# Altium footprint library texas.PCBLIB: 168 footprints (part 1 of 14)
Each footprint in its own frame and in the unit in brackets; x right, y up, seen from the top. Pads: shape width x height; smd on the part's side, far side on the other; paste and mask are expansions set on the pad; w line width, h text height; cw(c..) or ccw(c..) is an arc to the next point about the centre after c.
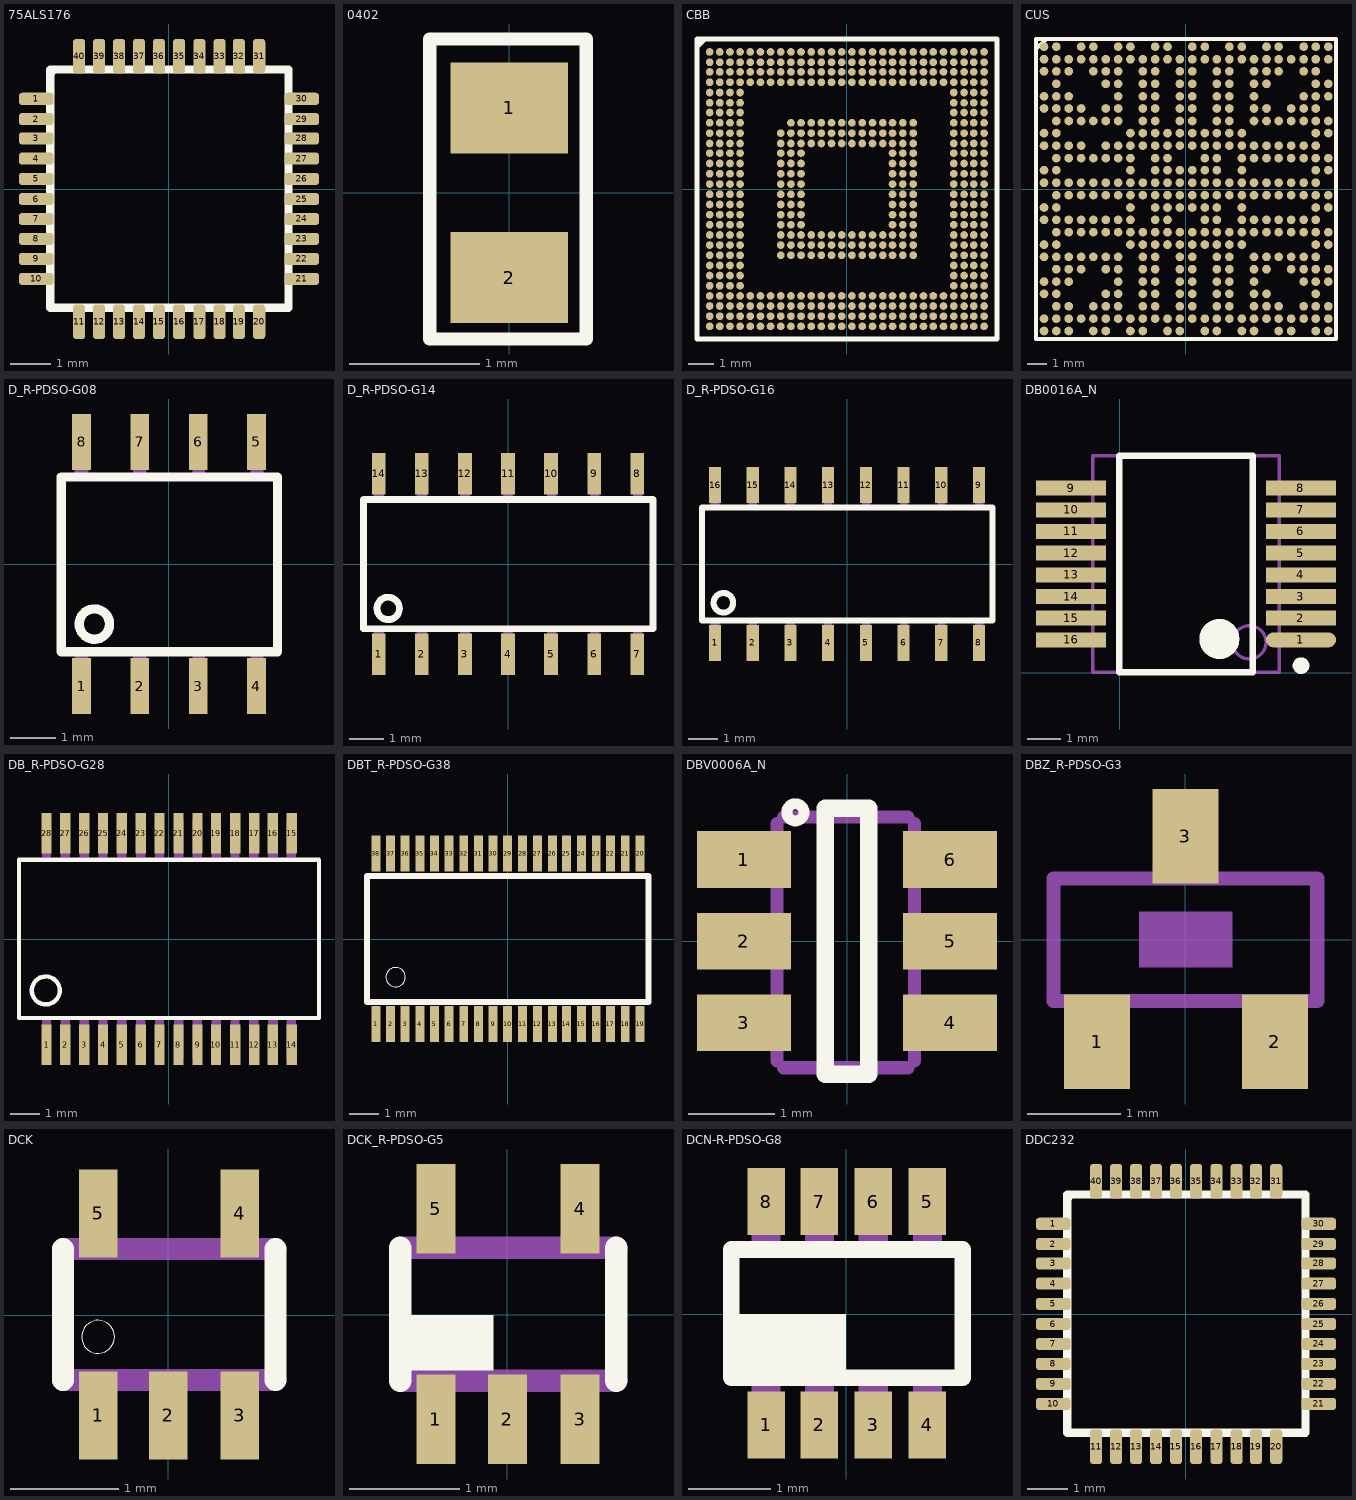
[diagram p0: the footprints below, top view; thin cyan lines are the x and y axes]

## 75ALS176 [mil]
pads (40):
  rrect50% 34x12 smd: 1(-130.91,89) 2(-130.91,69) 3(-130.91,50) 4(-130.91,30) 5(-130.91,10) 6(-130.91,-9.84) 7(-130.91,-29.53) 8(-130.91,-49.21) 9(-130.91,-68.9) 10(-130.91,-88.58) 21(131,-88.58) 22(131,-68.9) 23(131,-49.21) 24(131,-29.53) 25(131,-9.84) 26(131,10) 27(131,30) 28(131,50) 29(131,69) 30(131,89)
  rrect50% 12x34 smd: 11(-88.58,-130.91) 12(-68.9,-130.91) 13(-49.21,-130.91) 14(-29.53,-130.91) 15(-9.84,-130.91) 16(10,-130.91) 17(30,-130.91) 18(50,-130.91) 19(69,-130.91) 20(89,-130.91) 31(89,131) 32(69,131) 33(50,131) 34(30,131) 35(10,131) 36(-9.84,131) 37(-29.53,131) 38(-49.21,131) 39(-68.9,131) 40(-88.58,131)
Top Overlay:
  lines w8: -117.06,114 -113.19,118 ; -117.06,-117.06 118,-117.06 118,118 -117.06,118 -117.06,-117.06
Mechanical 4:
  rectangle: -133.86,85 -121.06,94
  rectangle: -133.86,65 -121.06,74
  rectangle: -133.86,45 -121.06,54
  rectangle: -133.86,25 -121.06,35
  rectangle: -133.86,6 -121.06,15
  rectangle: -133.86,-14.37 -121.06,-5.32
  rectangle: -133.86,-34.06 -121.06,-25
  rectangle: -133.86,-53.74 -121.06,-44.69
  rectangle: -133.86,-73.43 -121.06,-64.37
  rectangle: -133.86,-93.11 -121.06,-84.06
  rectangle: -93.11,-133.86 -84.06,-121.06
  rectangle: -73.43,-133.86 -64.37,-121.06
  rectangle: -53.74,-133.86 -44.69,-121.06
  rectangle: -34.06,-133.86 -25,-121.06
  rectangle: -14.37,-133.86 -5.32,-121.06
  rectangle: 6,-133.86 15,-121.06
  rectangle: 25,-133.86 35,-121.06
  rectangle: 45,-133.86 54,-121.06
  rectangle: 65,-133.86 74,-121.06
  rectangle: 85,-133.86 94,-121.06
  rectangle: 122,-93.11 134,-84.06
  rectangle: 122,-73.43 134,-64.37
  rectangle: 122,-53.74 134,-44.69
  rectangle: 122,-34.06 134,-25
  rectangle: 122,-14.37 134,-5.32
  rectangle: 122,6 134,15
  rectangle: 122,25 134,35
  rectangle: 122,45 134,54
  rectangle: 122,65 134,74
  rectangle: 122,85 134,94
  rectangle: 85,122 94,134
  rectangle: 65,122 74,134
  rectangle: 45,122 54,134
  rectangle: 25,122 35,134
  rectangle: 6,122 15,134
  rectangle: -14.37,122 -5.32,134
  rectangle: -34.06,122 -25,134
  rectangle: -53.74,122 -44.69,134
  rectangle: -73.43,122 -64.37,134
  rectangle: -93.11,122 -84.06,134

## 0402 [mm]
pads (2):
  rect 0.9x0.7 smd: 1(0,0.65) 2(0,-0.65)
Top Overlay:
  lines w0.102: -0.609,-1.121 -0.609,1.179 0.591,1.179 0.591,-1.121 -0.609,-1.121
3D body "wcr0603-402kfi.stp": height 0.45, standoff 0, extent -0.409,-0.821 0.391,0.779

## CBB [mil]
pads (515):
  rrect100% 12x12 smd: A1(-212.6,213) A2(-196.85,213) A3(-181.1,213) A4(-165.35,213) A5(-149.61,213) A6(-133.86,213) A7(-118.11,213) A8(-102.36,213) A9(-86.61,213) A10(-70.87,213) A11(-55.12,213) A12(-39.37,213) A13(-23.62,213) A14(-7.87,213) A15(8,213) A16(24,213) A17(40,213) A18(56,213) A19(71,213) A20(87,213) A21(103,213) A22(119,213) A23(134,213) A24(150,213) A25(166,213) A26(182,213) A27(197,213) A28(213,213) AA1(-212.6,-102.36) AA2(-196.85,-102.36) AA3(-181.1,-102.36) AA4(-165.35,-102.36) AA8(-102.36,-102.36) AA9(-86.61,-102.36) AA10(-70.87,-102.36) AA11(-55.12,-102.36) AA12(-39.37,-102.36) AA13(-23.62,-102.36) AA14(-7.87,-102.36) AA15(8,-102.36) AA16(24,-102.36) AA17(40,-102.36) AA18(56,-102.36) AA19(71,-102.36) AA20(87,-102.36) AA21(103,-102.36) AA25(166,-102.36) AA26(182,-102.36) AA27(197,-102.36) AA28(213,-102.36) AB1(-212.6,-118.11) AB2(-196.85,-118.11) AB3(-181.1,-118.11) AB4(-165.35,-118.11) AB25(166,-118.11) AB26(182,-118.11) AB27(197,-118.11) AB28(213,-118.11) AC1(-212.6,-133.86) AC2(-196.85,-133.86) AC3(-181.1,-133.86) AC4(-165.35,-133.86) AC25(166,-133.86) AC26(182,-133.86) AC27(197,-133.86) AC28(213,-133.86) AD1(-212.6,-149.61) AD2(-196.85,-149.61) AD3(-181.1,-149.61) AD4(-165.35,-149.61) AD25(166,-149.61) AD26(182,-149.61) AD27(197,-149.61) AD28(213,-149.61) AE1(-212.6,-165.35) AE2(-196.85,-165.35) AE3(-181.1,-165.35) AE4(-165.35,-165.35) AE5(-149.61,-165.35) AE6(-133.86,-165.35) AE7(-118.11,-165.35) AE8(-102.36,-165.35) AE9(-86.61,-165.35) AE10(-70.87,-165.35) AE11(-55.12,-165.35) AE12(-39.37,-165.35) AE13(-23.62,-165.35) AE14(-7.87,-165.35) AE15(8,-165.35) AE16(24,-165.35) AE17(40,-165.35) AE18(56,-165.35) AE19(71,-165.35) AE20(87,-165.35) AE21(103,-165.35) AE22(119,-165.35) AE23(134,-165.35) AE24(150,-165.35) AE25(166,-165.35) AE26(182,-165.35) AE27(197,-165.35) AE28(213,-165.35) AF1(-212.6,-181.1) AF2(-196.85,-181.1) AF3(-181.1,-181.1) AF4(-165.35,-181.1) AF5(-149.61,-181.1) AF6(-133.86,-181.1) AF7(-118.11,-181.1) AF8(-102.36,-181.1) AF9(-86.61,-181.1) AF10(-70.87,-181.1) AF11(-55.12,-181.1) AF12(-39.37,-181.1) AF13(-23.62,-181.1) AF14(-7.87,-181.1) AF15(8,-181.1) AF16(24,-181.1) AF17(40,-181.1) AF18(56,-181.1) AF19(71,-181.1) AF20(87,-181.1) AF21(103,-181.1) AF22(119,-181.1) AF23(134,-181.1) AF24(150,-181.1) AF25(166,-181.1) AF26(182,-181.1) AF27(197,-181.1) AF28(213,-181.1) AG1(-212.6,-196.85) AG2(-196.85,-196.85) AG3(-181.1,-196.85) AG4(-165.35,-196.85) AG5(-149.61,-196.85) AG6(-133.86,-196.85) AG7(-118.11,-196.85) AG8(-102.36,-196.85) AG9(-86.61,-196.85) AG10(-70.87,-196.85) AG11(-55.12,-196.85) AG12(-39.37,-196.85) AG13(-23.62,-196.85) AG14(-7.87,-196.85) AG15(8,-196.85) AG16(24,-196.85) AG17(40,-196.85) AG18(56,-196.85) AG19(71,-196.85) AG20(87,-196.85) AG21(103,-196.85) AG22(119,-196.85) AG23(134,-196.85) AG24(150,-196.85) AG25(166,-196.85) AG26(182,-196.85) AG27(197,-196.85) AG28(213,-196.85) AH1(-212.6,-212.6) AH2(-196.85,-212.6) AH3(-181.1,-212.6) AH4(-165.35,-212.6) AH5(-149.61,-212.6) AH6(-133.86,-212.6) AH7(-118.11,-212.6) AH8(-102.36,-212.6) AH9(-86.61,-212.6) AH10(-70.87,-212.6) AH11(-55.12,-212.6) AH12(-39.37,-212.6) AH13(-23.62,-212.6) AH14(-7.87,-212.6) AH15(8,-212.6) AH16(24,-212.6) AH17(40,-212.6) AH18(56,-212.6) AH19(71,-212.6) AH20(87,-212.6) AH21(103,-212.6) AH22(119,-212.6) AH23(134,-212.6) AH24(150,-212.6) AH25(166,-212.6) AH26(182,-212.6) AH27(197,-212.6) AH28(213,-212.6) B1(-212.6,197) B2(-196.85,197) B3(-181.1,197) B4(-165.35,197) B5(-149.61,197) B6(-133.86,197) B7(-118.11,197) B8(-102.36,197) B9(-86.61,197) B10(-70.87,197) B11(-55.12,197) B12(-39.37,197) B13(-23.62,197) B14(-7.87,197) B15(8,197) B16(24,197) B17(40,197) B18(56,197) B19(71,197) B20(87,197) B21(103,197) B22(119,197) B23(134,197) B24(150,197) B25(166,197) B26(182,197) B27(197,197) B28(213,197) C1(-212.6,182) C2(-196.85,182) C3(-181.1,182) C4(-165.35,182) C5(-149.61,182) C6(-133.86,182) C7(-118.11,182) C8(-102.36,182) C9(-86.61,182) C10(-70.87,182) C11(-55.12,182) C12(-39.37,182) C13(-23.62,182) C14(-7.87,182) C15(8,182) C16(24,182) C17(40,182) C18(56,182) C19(71,182) C20(87,182) C21(103,182) C22(119,182) C23(134,182) C24(150,182) C25(166,182) C26(182,182) C27(197,182) C28(213,182) D1(-212.6,166) D2(-196.85,166) D3(-181.1,166) D4(-165.35,166) D5(-149.61,166) D6(-133.86,166) D7(-118.11,166) D8(-102.36,166) D9(-86.61,166) D10(-70.87,166) D11(-55.12,166) D12(-39.37,166) D13(-23.62,166) D14(-7.87,166) D15(8,166) D16(24,166) D17(40,166) D18(56,166) D19(71,166) D20(87,166) D21(103,166) D22(119,166) D23(134,166) D24(150,166) D25(166,166) D26(182,166) D27(197,166) D28(213,166) E1(-212.6,150) E2(-196.85,150) E3(-181.1,150) E4(-165.35,150) E25(166,150) E26(182,150) E27(197,150) E28(213,150) F1(-212.6,134) F2(-196.85,134) F3(-181.1,134) F4(-165.35,134) F25(166,134) F26(182,134) F27(197,134) F28(213,134) G1(-212.6,119) G2(-196.85,119) G3(-181.1,119) G4(-165.35,119) G25(166,119) G26(182,119) G27(197,119) G28(213,119) H1(-212.6,103) H2(-196.85,103) H3(-181.1,103) H4(-165.35,103) H9(-86.61,103) H10(-70.87,103) H11(-55.12,103) H12(-39.37,103) H13(-23.62,103) H14(-7.87,103) H15(8,103) H16(24,103) H17(40,103) H18(56,103) H19(71,103) H20(87,103) H21(103,103) H25(166,103) H26(182,103) H27(197,103) H28(213,103) J1(-212.6,87) J2(-196.85,87) J3(-181.1,87) J4(-165.35,87) J8(-102.36,87) J9(-86.61,87) J10(-70.87,87) J11(-55.12,87) J12(-39.37,87) J13(-23.62,87) J14(-7.87,87) J15(8,87) J16(24,87) J17(40,87) J18(56,87) J19(71,87) J20(87,87) J21(103,87) J25(166,87) J26(182,87) J27(197,87) J28(213,87) K1(-212.6,71) K2(-196.85,71) K3(-181.1,71) K4(-165.35,71) K8(-102.36,71) K9(-86.61,71) K10(-70.87,71) K11(-55.12,71) K12(-39.37,71) K13(-23.62,71) K14(-7.87,71) K15(8,71) K16(24,71) K17(40,71) K18(56,71) K19(71,71) K20(87,71) K21(103,71) K25(166,71) K26(182,71) K27(197,71) K28(213,71) L1(-212.6,56) L2(-196.85,56) L3(-181.1,56) L4(-165.35,56) L8(-102.36,56) L9(-86.61,56) L10(-70.87,56) L19(71,56) L20(87,56) L21(103,56) L25(166,56) L26(182,56) L27(197,56) L28(213,56) M1(-212.6,40) M2(-196.85,40) M3(-181.1,40) M4(-165.35,40) M8(-102.36,40) M9(-86.61,40) M10(-70.87,40) M19(71,40) M20(87,40) M21(103,40) M25(166,40) M26(182,40) M27(197,40) M28(213,40) N1(-212.6,24) N2(-196.85,24) N3(-181.1,24) N4(-165.35,24) N8(-102.36,24) N9(-86.61,24) N10(-70.87,24) N19(71,24) N20(87,24) N21(103,24) N25(166,24) N26(182,24) N27(197,24) N28(213,24) P1(-212.6,8) P2(-196.85,8) P3(-181.1,8) P4(-165.35,8) P8(-102.36,8) P9(-86.61,8) P10(-70.87,8) P19(71,8) P20(87,8) P21(103,8) P25(166,8) P26(182,8) P27(197,8) P28(213,8) R1(-212.6,-7.87) R2(-196.85,-7.87) R3(-181.1,-7.87) R4(-165.35,-7.87) R8(-102.36,-7.87) R9(-86.61,-7.87) R10(-70.87,-7.87) R19(71,-7.87) R20(87,-7.87) R21(103,-7.87) R25(166,-7.87) R26(182,-7.87) R27(197,-7.87) R28(213,-7.87) T1(-212.6,-23.62) T2(-196.85,-23.62) T3(-181.1,-23.62) T4(-165.35,-23.62) T8(-102.36,-23.62) T9(-86.61,-23.62) T10(-70.87,-23.62) T19(71,-23.62) T20(87,-23.62) T21(103,-23.62) T25(166,-23.62) T26(182,-23.62) T27(197,-23.62) T28(213,-23.62) U1(-212.6,-39.37) U2(-196.85,-39.37) U3(-181.1,-39.37) U4(-165.35,-39.37) U8(-102.36,-39.37) U9(-86.61,-39.37) U10(-70.87,-39.37) U19(71,-39.37) U20(87,-39.37) U21(103,-39.37) U25(166,-39.37) U26(182,-39.37) U27(197,-39.37) U28(213,-39.37) V1(-212.6,-55.12) V2(-196.85,-55.12) V3(-181.1,-55.12) V4(-165.35,-55.12) V8(-102.36,-55.12) V9(-86.61,-55.12) V10(-70.87,-55.12) V19(71,-55.12) V20(87,-55.12) V21(103,-55.12) V25(166,-55.12) V26(182,-55.12) V27(197,-55.12) V28(213,-55.12) W1(-212.6,-70.87) W2(-196.85,-70.87) W3(-181.1,-70.87) W4(-165.35,-70.87) W8(-102.36,-70.87) W9(-86.61,-70.87) W10(-70.87,-70.87) W11(-55.12,-70.87) W12(-39.37,-70.87) W13(-23.62,-70.87) W14(-7.87,-70.87) W15(8,-70.87) W16(24,-70.87) W17(40,-70.87) W18(56,-70.87) W19(71,-70.87) W20(87,-70.87) W21(103,-70.87) W25(166,-70.87) W26(182,-70.87) W27(197,-70.87) W28(213,-70.87) Y1(-212.6,-86.61) Y2(-196.85,-86.61) Y3(-181.1,-86.61) Y4(-165.35,-86.61) Y8(-102.36,-86.61) Y9(-86.61,-86.61) Y10(-70.87,-86.61) Y11(-55.12,-86.61) Y12(-39.37,-86.61) Y13(-23.62,-86.61) Y14(-7.87,-86.61) Y15(8,-86.61) Y16(24,-86.61) Y17(40,-86.61) Y18(56,-86.61) Y19(71,-86.61) Y20(87,-86.61) Y21(103,-86.61) Y25(166,-86.61) Y26(182,-86.61) Y27(197,-86.61) Y28(213,-86.61)
Top Overlay:
  lines w8: -232.22,221 -220.47,233 ; -232.22,221 -232.22,-232.22 233,-232.22 233,233 -220.47,233 ; -232.22,221 -232.22,233 -220.47,233
Top Solder:
  drawing of 515 lines, arcs and shapes, not listed

## CUS [mil]
pads (423):
  rrect100% 18x18 smd: A1(-294.29,295) A2(-268.7,295) A4(-217.52,295) A5(-191.93,295) A7(-140.75,295) A8(-115.16,295) A10(-63.98,295) A11(-38.39,295) A13(13,295) A14(39,295) A16(90,295) A17(116,295) A19(167,295) A20(192,295) A22(244,295) A23(269,295) A24(295,295) AA1(-294.29,-217.52) AA2(-268.7,-217.52) AA6(-166.34,-217.52) AA7(-140.75,-217.52) AA9(-89.57,-217.52) AA10(-63.98,-217.52) AA12(-12.8,-217.52) AA13(13,-217.52) AA15(64,-217.52) AA16(90,-217.52) AA18(141,-217.52) AA19(167,-217.52) AA23(269,-217.52) AB2(-268.7,-243.11) AB3(-243.11,-243.11) AB5(-191.93,-243.11) AB6(-166.34,-243.11) AB7(-140.75,-243.11) AB9(-89.57,-243.11) AB10(-63.98,-243.11) AB12(-12.8,-243.11) AB13(13,-243.11) AB15(64,-243.11) AB16(90,-243.11) AB18(141,-243.11) AB19(167,-243.11) AB20(192,-243.11) AB22(244,-243.11) AB23(269,-243.11) AB24(295,-243.11) AC1(-294.29,-268.7) AC2(-268.7,-268.7) AC3(-243.11,-268.7) AC4(-217.52,-268.7) AC5(-191.93,-268.7) AC6(-166.34,-268.7) AC7(-140.75,-268.7) AC8(-115.16,-268.7) AC9(-89.57,-268.7) AC10(-63.98,-268.7) AC11(-38.39,-268.7) AC12(-12.8,-268.7) AC13(13,-268.7) AC14(39,-268.7) AC15(64,-268.7) AC16(90,-268.7) AC17(116,-268.7) AC18(141,-268.7) AC19(167,-268.7) AC20(192,-268.7) AC21(218,-268.7) AC22(244,-268.7) AC23(269,-268.7) AC24(295,-268.7) AD1(-294.29,-294.29) AD2(-268.7,-294.29) AD3(-243.11,-294.29) AD5(-191.93,-294.29) AD6(-166.34,-294.29) AD8(-115.16,-294.29) AD9(-89.57,-294.29) AD11(-38.39,-294.29) AD12(-12.8,-294.29) AD14(39,-294.29) AD15(64,-294.29) AD17(116,-294.29) AD18(141,-294.29) AD20(192,-294.29) AD21(218,-294.29) AD23(269,-294.29) AD24(295,-294.29) B1(-294.29,269) B2(-268.7,269) B3(-243.11,269) B4(-217.52,269) B5(-191.93,269) B6(-166.34,269) B7(-140.75,269) B8(-115.16,269) B9(-89.57,269) B10(-63.98,269) B11(-38.39,269) B12(-12.8,269) B13(13,269) B14(39,269) B15(64,269) B16(90,269) B17(116,269) B18(141,269) B19(167,269) B20(192,269) B21(218,269) B22(244,269) B23(269,269) B24(295,269) C1(-294.29,244) C2(-268.7,244) C3(-243.11,244) C5(-191.93,244) C6(-166.34,244) C7(-140.75,244) C9(-89.57,244) C10(-63.98,244) C12(-12.8,244) C13(13,244) C15(64,244) C16(90,244) C18(141,244) C19(167,244) C20(192,244) C22(244,244) C23(269,244) D2(-268.7,218) D6(-166.34,218) D7(-140.75,218) D9(-89.57,218) D10(-63.98,218) D12(-12.8,218) D13(13,218) D15(64,218) D16(90,218) D18(141,218) D19(167,218) D23(269,218) D24(295,218) E1(-294.29,192) E2(-268.7,192) E3(-243.11,192) E7(-140.75,192) E9(-89.57,192) E10(-63.98,192) E12(-12.8,192) E13(13,192) E15(64,192) E16(90,192) E18(141,192) E22(244,192) E23(269,192) E24(295,192) F1(-294.29,167) F2(-268.7,167) F3(-243.11,167) F4(-217.52,167) F6(-166.34,167) F7(-140.75,167) F9(-89.57,167) F10(-63.98,167) F12(-12.8,167) F13(13,167) F15(64,167) F16(90,167) F18(141,167) F19(167,167) F21(218,167) F22(244,167) F23(269,167) G2(-268.7,141) G3(-243.11,141) G4(-217.52,141) G5(-191.93,141) G6(-166.34,141) G7(-140.75,141) G9(-89.57,141) G10(-63.98,141) G12(-12.8,141) G13(13,141) G15(64,141) G16(90,141) G18(141,141) G19(167,141) G20(192,141) G21(218,141) G22(244,141) G23(269,141) G24(295,141) H1(-294.29,116) H2(-268.7,116) H8(-115.16,116) H9(-89.57,116) H10(-63.98,116) H11(-38.39,116) H12(-12.8,116) H13(13,116) H14(39,116) H15(64,116) H16(90,116) H17(116,116) H23(269,116) H24(295,116) J1(-294.29,90) J2(-268.7,90) J3(-243.11,90) J4(-217.52,90) J6(-166.34,90) J7(-140.75,90) J8(-115.16,90) J9(-89.57,90) J10(-63.98,90) J11(-38.39,90) J12(-12.8,90) J13(13,90) J14(39,90) J15(64,90) J16(90,90) J17(116,90) J18(141,90) J19(167,90) J20(192,90) J21(218,90) J22(244,90) J23(269,90) K2(-268.7,64) K3(-243.11,64) K4(-217.52,64) K5(-191.93,64) K6(-166.34,64) K7(-140.75,64) K8(-115.16,64) K10(-63.98,64) K11(-38.39,64) K14(39,64) K15(64,64) K17(116,64) K18(141,64) K19(167,64) K20(192,64) K21(218,64) K22(244,64) K23(269,64) K24(295,64) L1(-294.29,39) L2(-268.7,39) L8(-115.16,39) L10(-63.98,39) L11(-38.39,39) L12(-12.8,39) L13(13,39) L14(39,39) L15(64,39) L17(116,39) L23(269,39) L24(295,39) M1(-294.29,13) M2(-268.7,13) M3(-243.11,13) M4(-217.52,13) M5(-191.93,13) M6(-166.34,13) M7(-140.75,13) M8(-115.16,13) M9(-89.57,13) M10(-63.98,13) M11(-38.39,13) M12(-12.8,13) M13(13,13) M14(39,13) M15(64,13) M16(90,13) M17(116,13) M18(141,13) M19(167,13) M20(192,13) M21(218,13) M22(244,13) M23(269,13) N2(-268.7,-12.8) N3(-243.11,-12.8) N4(-217.52,-12.8) N5(-191.93,-12.8) N6(-166.34,-12.8) N7(-140.75,-12.8) N8(-115.16,-12.8) N9(-89.57,-12.8) N10(-63.98,-12.8) N11(-38.39,-12.8) N12(-12.8,-12.8) N13(13,-12.8) N14(39,-12.8) N15(64,-12.8) N16(90,-12.8) N17(116,-12.8) N18(141,-12.8) N19(167,-12.8) N20(192,-12.8) N21(218,-12.8) N22(244,-12.8) N23(269,-12.8) N24(295,-12.8) P1(-294.29,-38.39) P2(-268.7,-38.39) P8(-115.16,-38.39) P10(-63.98,-38.39) P11(-38.39,-38.39) P12(-12.8,-38.39) P13(13,-38.39) P14(39,-38.39) P15(64,-38.39) P17(116,-38.39) P23(269,-38.39) P24(295,-38.39) R1(-294.29,-63.98) R2(-268.7,-63.98) R3(-243.11,-63.98) R4(-217.52,-63.98) R5(-191.93,-63.98) R6(-166.34,-63.98) R7(-140.75,-63.98) R8(-115.16,-63.98) R10(-63.98,-63.98) R11(-38.39,-63.98) R14(39,-63.98) R15(64,-63.98) R17(116,-63.98) R18(141,-63.98) R19(167,-63.98) R20(192,-63.98) R21(218,-63.98) R22(244,-63.98) R23(269,-63.98) T2(-268.7,-89.57) T3(-243.11,-89.57) T4(-217.52,-89.57) T5(-191.93,-89.57) T6(-166.34,-89.57) T7(-140.75,-89.57) T8(-115.16,-89.57) T9(-89.57,-89.57) T10(-63.98,-89.57) T11(-38.39,-89.57) T12(-12.8,-89.57) T13(13,-89.57) T14(39,-89.57) T15(64,-89.57) T16(90,-89.57) T17(116,-89.57) T18(141,-89.57) T19(167,-89.57) T20(192,-89.57) T21(218,-89.57) T22(244,-89.57) T23(269,-89.57) T24(295,-89.57) U1(-294.29,-115.16) U2(-268.7,-115.16) U8(-115.16,-115.16) U9(-89.57,-115.16) U10(-63.98,-115.16) U11(-38.39,-115.16) U12(-12.8,-115.16) U13(13,-115.16) U14(39,-115.16) U15(64,-115.16) U16(90,-115.16) U17(116,-115.16) U23(269,-115.16) U24(295,-115.16) V1(-294.29,-140.75) V2(-268.7,-140.75) V3(-243.11,-140.75) V4(-217.52,-140.75) V5(-191.93,-140.75) V6(-166.34,-140.75) V7(-140.75,-140.75) V9(-89.57,-140.75) V10(-63.98,-140.75) V12(-12.8,-140.75) V13(13,-140.75) V15(64,-140.75) V16(90,-140.75) V18(141,-140.75) V19(167,-140.75) V20(192,-140.75) V21(218,-140.75) V22(244,-140.75) V23(269,-140.75) W2(-268.7,-166.34) W3(-243.11,-166.34) W4(-217.52,-166.34) W6(-166.34,-166.34) W7(-140.75,-166.34) W9(-89.57,-166.34) W10(-63.98,-166.34) W12(-12.8,-166.34) W13(13,-166.34) W15(64,-166.34) W16(90,-166.34) W18(141,-166.34) W19(167,-166.34) W21(218,-166.34) W22(244,-166.34) W23(269,-166.34) W24(295,-166.34) Y1(-294.29,-191.93) Y2(-268.7,-191.93) Y3(-243.11,-191.93) Y7(-140.75,-191.93) Y9(-89.57,-191.93) Y10(-63.98,-191.93) Y12(-12.8,-191.93) Y13(13,-191.93) Y15(64,-191.93) Y16(90,-191.93) Y18(141,-191.93) Y22(244,-191.93) Y23(269,-191.93) Y24(295,-191.93)
Top Overlay:
  lines w8: -310.96,290 -310.96,311 -289.37,311 ; -310.96,290 -310.96,-310.96 311,-310.96 311,311 -289.37,311 ; -310.96,290 -289.37,311
Top Solder:
  drawing of 423 lines, arcs and shapes, not listed

## D_R-PDSO-G08 [mil]
pads (8):
  rect 16x48 smd: 1(-75,-104.33) 2(-25,-104.33) 3(25,-104.33) 4(75,-104.33) 5(75,105) 6(25,105) 7(-25,105) 8(-75,105)
Top Overlay:
  circle w8: c-63.98,-51.18 r13
  lines w8: -92.52,-74.8 -92.52,75 93,75 93,-74.8 -92.52,-74.8
Mechanical 4:
  region: -69.09,121 -80.91,121 -80.91,78 -69.09,78
  region: -19.09,121 -30.91,121 -30.91,78 -19.09,78
  region: 31,121 20,121 20,78 31,78
  region: 81,121 70,121 70,78 81,78
  rectangle: 70,-120.08 81,-77.95
  rectangle: 20,-120.08 31,-77.95
  rectangle: -30.91,-120.08 -19.09,-77.95
  rectangle: -80.91,-120.08 -69.09,-77.95

## D_R-PDSO-G14 [mil]
pads (14):
  rect 16x48 smd: 1(-150,-104.33) 2(-100,-104.33) 3(-50,-104.33) 4(0,-104.33) 5(50,-104.33) 6(100,-104.33) 7(150,-104.33) 8(150,105) 9(100,105) 10(50,105) 11(0,105) 12(-50,105) 13(-100,105) 14(-150,105)
Top Overlay:
  circle w8: c-138.98,-51.18 r13
  lines w8: -167.52,-74.8 -167.52,75 168,75 168,-74.8 -167.52,-74.8
Mechanical 4:
  region: -144.09,121 -155.91,121 -155.91,78 -144.09,78
  region: -94.09,121 -105.91,121 -105.91,78 -94.09,78
  region: -44.09,121 -55.91,121 -55.91,78 -44.09,78
  region: 6,121 -5.91,121 -5.91,78 6,78
  region: 56,121 45,121 45,78 56,78
  region: 106,121 95,121 95,78 106,78
  region: 156,121 145,121 145,78 156,78
  rectangle: 145,-120.08 156,-77.95
  rectangle: 95,-120.08 106,-77.95
  rectangle: 45,-120.08 56,-77.95
  rectangle: -5.91,-120.08 6,-77.95
  rectangle: -55.91,-120.08 -44.09,-77.95
  rectangle: -105.91,-120.08 -94.09,-77.95
  rectangle: -155.91,-120.08 -144.09,-77.95

## D_R-PDSO-G16 [mil]
pads (16):
  rect 16x48 smd: 1(-175,-104.33) 2(-125,-104.33) 3(-75,-104.33) 4(-25,-104.33) 5(25,-104.33) 6(75,-104.33) 7(125,-104.33) 8(175,-104.33) 9(175,105) 10(125,105) 11(75,105) 12(25,105) 13(-25,105) 14(-75,105) 15(-125,105) 16(-175,105)
Top Overlay:
  circle w8: c-163.98,-51.18 r13
  lines w8: -192.52,-74.8 -192.52,75 193,75 193,-74.8 -192.52,-74.8
Mechanical 4:
  region: -169.09,121 -180.91,121 -180.91,78 -169.09,78
  region: -119.09,121 -130.91,121 -130.91,78 -119.09,78
  region: -69.09,121 -80.91,121 -80.91,78 -69.09,78
  region: -19.09,121 -30.91,121 -30.91,78 -19.09,78
  region: 31,121 20,121 20,78 31,78
  region: 81,121 70,121 70,78 81,78
  region: 131,121 120,121 120,78 131,78
  region: 181,121 170,121 170,78 181,78
  rectangle: 170,-120.08 181,-77.95
  rectangle: 120,-120.08 131,-77.95
  rectangle: 70,-120.08 81,-77.95
  rectangle: 20,-120.08 31,-77.95
  rectangle: -30.91,-120.08 -19.09,-77.95
  rectangle: -80.91,-120.08 -69.09,-77.95
  rectangle: -130.91,-120.08 -119.09,-77.95
  rectangle: -180.91,-120.08 -169.09,-77.95

## DB0016A_N [mm]
pads (16):
  oval 2.1x0.45 smd: 1(5.444,0.993)
  rect 2.1x0.45 smd: 2(5.444,1.643) 3(5.444,2.293) 4(5.444,2.943) 5(5.444,3.593) 6(5.444,4.243) 7(5.444,4.893) 8(5.444,5.543) 9(-1.456,5.543) 10(-1.456,4.893) 11(-1.456,4.243) 12(-1.456,3.593) 13(-1.456,2.943) 14(-1.456,2.293) 15(-1.456,1.643) 16(-1.456,0.993)
Top Overlay:
  circle w0.25: c5.444,0.218 r0.125
  circle w0.6: c2.994,1.018 r0.3
  lines w0.2: -0.006,0.018 -0.006,6.518 3.994,6.518 3.994,0.018 -0.006,0.018
Mechanical 4:
  circle w0.1: c3.894,0.918 r0.5
  lines w0.1: -0.806,0.018 -0.806,6.518 4.794,6.518 4.794,0.018 -0.806,0.018
3D body "User Library-TSSOP16-3.STEP": height 1.2, standoff 0, extent -1.168,0.802 5.232,5.802

## DB_R-PDSO-G28 [mil]
pads (28):
  rect 14x55 smd: 1(-166.34,-143.94) 2(-140.75,-143.94) 3(-115.16,-143.94) 4(-89.57,-143.94) 5(-63.98,-143.94) 6(-38.39,-143.94) 7(-12.8,-143.94) 8(13,-143.94) 9(39,-143.94) 10(64,-143.94) 11(90,-143.94) 12(116,-143.94) 13(141,-143.94) 14(167,-143.94) 15(167,144) 16(141,144) 17(116,144) 18(90,144) 19(64,144) 20(39,144) 21(13,144) 22(-12.8,144) 23(-38.39,144) 24(-63.98,144) 25(-89.57,144) 26(-115.16,144) 27(-140.75,144) 28(-166.34,144)
Top Overlay:
  circle w6: c-167.32,-69.88 r19
  lines w6: -203.74,-107.28 -203.74,108 204,108 204,-107.28 -203.74,-107.28
Mechanical 4:
  rectangle: 160,-161.42 173,-110.24
  rectangle: 135,-161.42 148,-110.24
  rectangle: 109,-161.42 122,-110.24
  rectangle: 84,-161.42 96,-110.24
  rectangle: 58,-161.42 71,-110.24
  rectangle: 32,-161.42 45,-110.24
  rectangle: 7,-161.42 20,-110.24
  rectangle: -19.19,-161.42 -6.4,-110.24
  rectangle: -44.78,-161.42 -31.99,-110.24
  rectangle: -70.37,-161.42 -57.58,-110.24
  rectangle: -95.96,-161.42 -83.17,-110.24
  rectangle: 160,111 173,162
  rectangle: 135,111 148,162
  rectangle: 109,111 122,162
  rectangle: 84,111 96,162
  rectangle: 58,111 71,162
  rectangle: 32,111 45,162
  rectangle: 7,111 20,162
  rectangle: -19.19,111 -6.4,162
  rectangle: -44.78,111 -31.99,162
  rectangle: -70.37,111 -57.58,162
  rectangle: -95.96,111 -83.17,162
  rectangle: -121.56,111 -108.76,162
  rectangle: -147.15,111 -134.35,162
  rectangle: -121.56,-161.42 -108.76,-110.24
  rectangle: -147.15,-161.42 -134.35,-110.24
  rectangle: -172.74,-161.42 -159.94,-110.24
  rectangle: -172.74,111 -159.94,162

## DBT_R-PDSO-G38 [mil]
pads (38):
  rect 12x48 smd: 1(-177.17,-114.17) 2(-157.48,-114.17) 3(-137.8,-114.17) 4(-118.11,-114.17) 5(-98.43,-114.17) 6(-78.74,-114.17) 7(-59.06,-114.17) 8(-39.37,-114.17) 9(-19.68,-114.17) 10(0,-114.17) 11(20,-114.17) 12(40,-114.17) 13(60,-114.17) 14(79,-114.17) 15(99,-114.17) 16(119,-114.17) 17(138,-114.17) 18(158,-114.17) 19(178,-114.17) 20(178,115) 21(158,115) 22(138,115) 23(119,115) 24(99,115) 25(79,115) 26(60,115) 27(40,115) 28(20,115) 29(0,115) 30(-19.68,115) 31(-39.37,115) 32(-59.06,115) 33(-78.74,115) 34(-98.43,115) 35(-118.11,115) 36(-137.8,115) 37(-157.48,115) 38(-177.17,115)
Top Overlay:
  circle w0: c-150.59,-51.18 r13
  lines w8: -188.98,-84.65 -188.98,85 189,85 189,-84.65 -188.98,-84.65
Top Solder:
  region: -170.28,140 -184.06,140 -184.06,89 -170.28,89
  region: -150.59,140 -164.37,140 -164.37,89 -150.59,89
  region: -130.91,140 -144.69,140 -144.69,89 -130.91,89
  region: -111.22,140 -125,140 -125,89 -111.22,89
  region: -91.54,140 -105.31,140 -105.31,89 -91.54,89
  region: -71.85,140 -85.63,140 -85.63,89 -71.85,89
  region: -52.17,140 -65.94,140 -65.94,89 -52.17,89
  region: -32.48,140 -46.26,140 -46.26,89 -32.48,89
  region: -12.8,140 -26.57,140 -26.57,89 -12.8,89
  region: 7,140 -6.89,140 -6.89,89 7,89
  region: 27,140 13,140 13,89 27,89
  region: 47,140 33,140 33,89 47,89
  region: 66,140 53,140 53,89 66,89
  region: 86,140 72,140 72,89 86,89
  region: 106,140 92,140 92,89 106,89
  region: 125,140 112,140 112,89 125,89
  region: 145,140 131,140 131,89 145,89
  region: 165,140 151,140 151,89 165,89
  region: 185,140 171,140 171,89 185,89
  rectangle: 171,-139.76 185,-88.58
  rectangle: 151,-139.76 165,-88.58
  rectangle: 131,-139.76 145,-88.58
  rectangle: 112,-139.76 125,-88.58
  rectangle: 92,-139.76 106,-88.58
  rectangle: 72,-139.76 86,-88.58
  rectangle: 53,-139.76 66,-88.58
  rectangle: 33,-139.76 47,-88.58
  rectangle: 13,-139.76 27,-88.58
  rectangle: -6.89,-139.76 7,-88.58
  rectangle: -26.57,-139.76 -12.8,-88.58
  rectangle: -46.26,-139.76 -32.48,-88.58
  rectangle: -65.94,-139.76 -52.17,-88.58
  rectangle: -85.63,-139.76 -71.85,-88.58
  rectangle: -105.31,-139.76 -91.54,-88.58
  rectangle: -125,-139.76 -111.22,-88.58
  rectangle: -144.69,-139.76 -130.91,-88.58
  rectangle: -164.37,-139.76 -150.59,-88.58
  rectangle: -184.06,-139.76 -170.28,-88.58

## DBV0006A_N [mil]
pads (6):
  rect 43x26 smd: 1(-47.24,37.4) 2(-47.24,0) 3(-47.24,-37.4) 4(47.24,-37.4) 5(47.24,0) 6(47.24,37.4)
Top Overlay:
  circle w5: c-23.62,59.06 r3.94
  lines w8: -10,-61 10,-61 10,61 -10,61 -10,-61
Mechanical 4:
  lines w0: -32,-55 ccw(c-28.95,-54.95) -29,-58 ; -32,54 cw(c-28.95,53.95) -29,57 ; 28,-58 ccw(c27.95,-54.95) 31,-55 ; 28,57 cw(c27.95,53.95) 31,54
  lines w6: -32,-55 -32,-46 ; -32,54 -32,45 ; -29,-58 28,-58 ; -29,57 28,57 ; 31,-55 31,-46 ; 31,54 31,45 ; -32,-46 -32,-30 ; -32,-46 -56,-46 -56,-30 -32,-30 ; -32,-30 -32,-8 ; -32,-8 -32,7 ; -32,-8 -56,-8 -56,7 -32,7 ; -32,7 -32,29 ; -32,29 -32,45 ; -32,29 -56,29 -56,45 -32,45 ; 31,-46 31,-30 ; 31,-46 56,-46 56,-30 31,-30 ; 31,-30 31,-8 ; 31,-8 56,-8 56,7 31,7 ; 31,-8 31,7 ; 31,7 31,29 ; 31,29 31,45 ; 31,29 56,29 56,45 31,45
3D body "User Library-sot236.step": height 39.37, standoff 0, extent -46.06,-57.48 46.07,57.48

## DBZ_R-PDSO-G3 [mil]
pads (3):
  rect 28x40 smd: 1(-37.4,-43.31) 2(38,-43.31) 3(0,44)
Mechanical 4:
  rectangle: -46,-51 -28,-28
  rectangle: 28,-51 46,-28
  rectangle: -9,28 9,51
  lines w6: -55.98,-25.98 -55.98,26 56,26 56,-25.98 -55.98,-25.98
Mechanical 6:
  rectangle: -19.69,-11.81 20,12

## DCK [mil]
pads (5):
  rect 14x32 smd: 1(-25.59,-36.42) 2(0,-36.42) 3(26,-36.42) 4(26,37) 5(-25.59,37)
Top Overlay:
  circle w0: c-25.59,-7.87 r6
  lines w8: -38.39,-23.62 -38.39,24 ; 39,-23.62 39,24
Top Solder:
  rectangle: -8.86,-54.13 9,-18.7
  rectangle: -34.45,-54.13 -16.73,-18.7
  rectangle: 17,-54.13 35,-18.7
  region: 35,55 17,55 17,19 35,19
  region: -16.73,55 -34.45,55 -34.45,19 -16.73,19
Mechanical 4:
  rectangle: 20,24 32,48
  rectangle: -31.5,24 -19.68,48
  rectangle: -31.5,-47.24 -19.68,-23.62
  rectangle: -5.91,-47.24 6,-23.62
  rectangle: 20,-47.24 32,-23.62
  lines w8: -38.39,-23.62 39,-23.62 ; -38.39,24 39,24

## DCK_R-PDSO-G5 [mil]
pads (5):
  rect 14x32 smd: 1(-25.59,-37.4) 2(0,-37.4) 3(26,-37.4) 4(26,38) 5(-25.59,38)
Top Overlay:
  rectangle: -40,-20 -5,0
  lines w8: -38.39,-23.62 -38.39,24 ; 39,-23.62 39,24
Mechanical 4:
  rectangle: 20,-47.24 32,-26.57
  rectangle: -5.91,-47.24 6,-26.57
  rectangle: -31.5,-47.24 -19.68,-26.57
  rectangle: -31.5,27 -19.68,48
  rectangle: 20,27 32,48
  lines w8: -38.39,-23.62 39,-23.62 ; -38.39,24 39,24

## DCN-R-PDSO-G8 [mil]
pads (8):
  rect 18x32 smd: 1(-38.39,-53.15) 2(-12.8,-53.15) 3(13,-53.15) 4(39,-53.15) 5(39,54) 6(13,54) 7(-12.8,54) 8(-38.39,54)
Top Overlay:
  rectangle: -55.12,-29.53 0,0
  lines w8: -55.12,-30.51 56,-30.51 56,31 -55.12,31 -55.12,-30.51
Top Paste:
  rectangle: -46.26,-67.91 -30.51,-38.39
  rectangle: -20.67,-67.91 -4.92,-38.39
  rectangle: 5,-67.91 21,-38.39
  rectangle: 31,-67.91 47,-38.39
  region: 47,68 31,68 31,39 47,39
  region: 21,68 5,68 5,39 21,39
  region: -4.92,68 -20.67,68 -20.67,39 -4.92,39
  region: -30.51,68 -46.26,68 -46.26,39 -30.51,39
Top Solder:
  rectangle: -48.23,-71.85 -28.54,-34.45
  rectangle: -22.64,-71.85 -2.95,-34.45
  rectangle: 3,-71.85 23,-34.45
  rectangle: 29,-71.85 49,-34.45
  region: 49,72 29,72 29,35 49,35
  region: 23,72 3,72 3,35 23,35
  region: -2.95,72 -22.64,72 -22.64,35 -2.95,35
  region: -28.54,72 -48.23,72 -48.23,35 -28.54,35
  region: 49,72 29,72 29,35 49,35
  region: 23,72 3,72 3,35 23,35
  region: -2.95,72 -22.64,72 -22.64,35 -2.95,35
  region: -28.54,72 -48.23,72 -48.23,35 -28.54,35
Mechanical 4:
  rectangle: -45.28,-59.06 -31.5,-32.48
  rectangle: -19.68,-59.06 -5.91,-32.48
  rectangle: 6,-59.06 20,-32.48
  rectangle: 32,-59.06 46,-32.48
  region: 46,60 32,60 32,33 46,33
  region: 20,60 6,60 6,33 20,33
  region: -5.91,60 -19.68,60 -19.68,33 -5.91,33
  region: -31.5,60 -45.28,60 -45.28,33 -31.5,33

## DDC232 [mil]
pads (40):
  rrect50% 34x12 smd: 1(-130.91,89) 2(-130.91,69) 3(-130.91,50) 4(-130.91,30) 5(-130.91,10) 6(-130.91,-9.84) 7(-130.91,-29.53) 8(-130.91,-49.21) 9(-130.91,-68.9) 10(-130.91,-88.58) 21(131,-88.58) 22(131,-68.9) 23(131,-49.21) 24(131,-29.53) 25(131,-9.84) 26(131,10) 27(131,30) 28(131,50) 29(131,69) 30(131,89)
  rrect50% 12x34 smd: 11(-88.58,-130.91) 12(-68.9,-130.91) 13(-49.21,-130.91) 14(-29.53,-130.91) 15(-9.84,-130.91) 16(10,-130.91) 17(30,-130.91) 18(50,-130.91) 19(69,-130.91) 20(89,-130.91) 31(89,131) 32(69,131) 33(50,131) 34(30,131) 35(10,131) 36(-9.84,131) 37(-29.53,131) 38(-49.21,131) 39(-68.9,131) 40(-88.58,131)
Top Overlay:
  lines w8: -117.06,114 -113.19,118 ; -117.06,-117.06 118,-117.06 118,118 -117.06,118 -117.06,-117.06
Mechanical 4:
  rectangle: -133.86,85 -121.06,94
  rectangle: -133.86,65 -121.06,74
  rectangle: -133.86,45 -121.06,54
  rectangle: -133.86,25 -121.06,35
  rectangle: -133.86,6 -121.06,15
  rectangle: -133.86,-14.37 -121.06,-5.32
  rectangle: -133.86,-34.06 -121.06,-25
  rectangle: -133.86,-53.74 -121.06,-44.69
  rectangle: -133.86,-73.43 -121.06,-64.37
  rectangle: -133.86,-93.11 -121.06,-84.06
  rectangle: -93.11,-133.86 -84.06,-121.06
  rectangle: -73.43,-133.86 -64.37,-121.06
  rectangle: -53.74,-133.86 -44.69,-121.06
  rectangle: -34.06,-133.86 -25,-121.06
  rectangle: -14.37,-133.86 -5.32,-121.06
  rectangle: 6,-133.86 15,-121.06
  rectangle: 25,-133.86 35,-121.06
  rectangle: 45,-133.86 54,-121.06
  rectangle: 65,-133.86 74,-121.06
  rectangle: 85,-133.86 94,-121.06
  rectangle: 122,-93.11 134,-84.06
  rectangle: 122,-73.43 134,-64.37
  rectangle: 122,-53.74 134,-44.69
  rectangle: 122,-34.06 134,-25
  rectangle: 122,-14.37 134,-5.32
  rectangle: 122,6 134,15
  rectangle: 122,25 134,35
  rectangle: 122,45 134,54
  rectangle: 122,65 134,74
  rectangle: 122,85 134,94
  rectangle: 85,122 94,134
  rectangle: 65,122 74,134
  rectangle: 45,122 54,134
  rectangle: 25,122 35,134
  rectangle: 6,122 15,134
  rectangle: -14.37,122 -5.32,134
  rectangle: -34.06,122 -25,134
  rectangle: -53.74,122 -44.69,134
  rectangle: -73.43,122 -64.37,134
  rectangle: -93.11,122 -84.06,134